# Altium footprint library Pcblib.PcbLib: 281 footprints (part 12 of 18)
Each footprint in its own frame and in the unit in brackets; x right, y up, seen from the top. Pads: shape width x height; smd on the part's side, far side on the other; paste and mask are expansions set on the pad; w line width, h text height; cw(c..) or ccw(c..) is an arc to the next point about the centre after c.
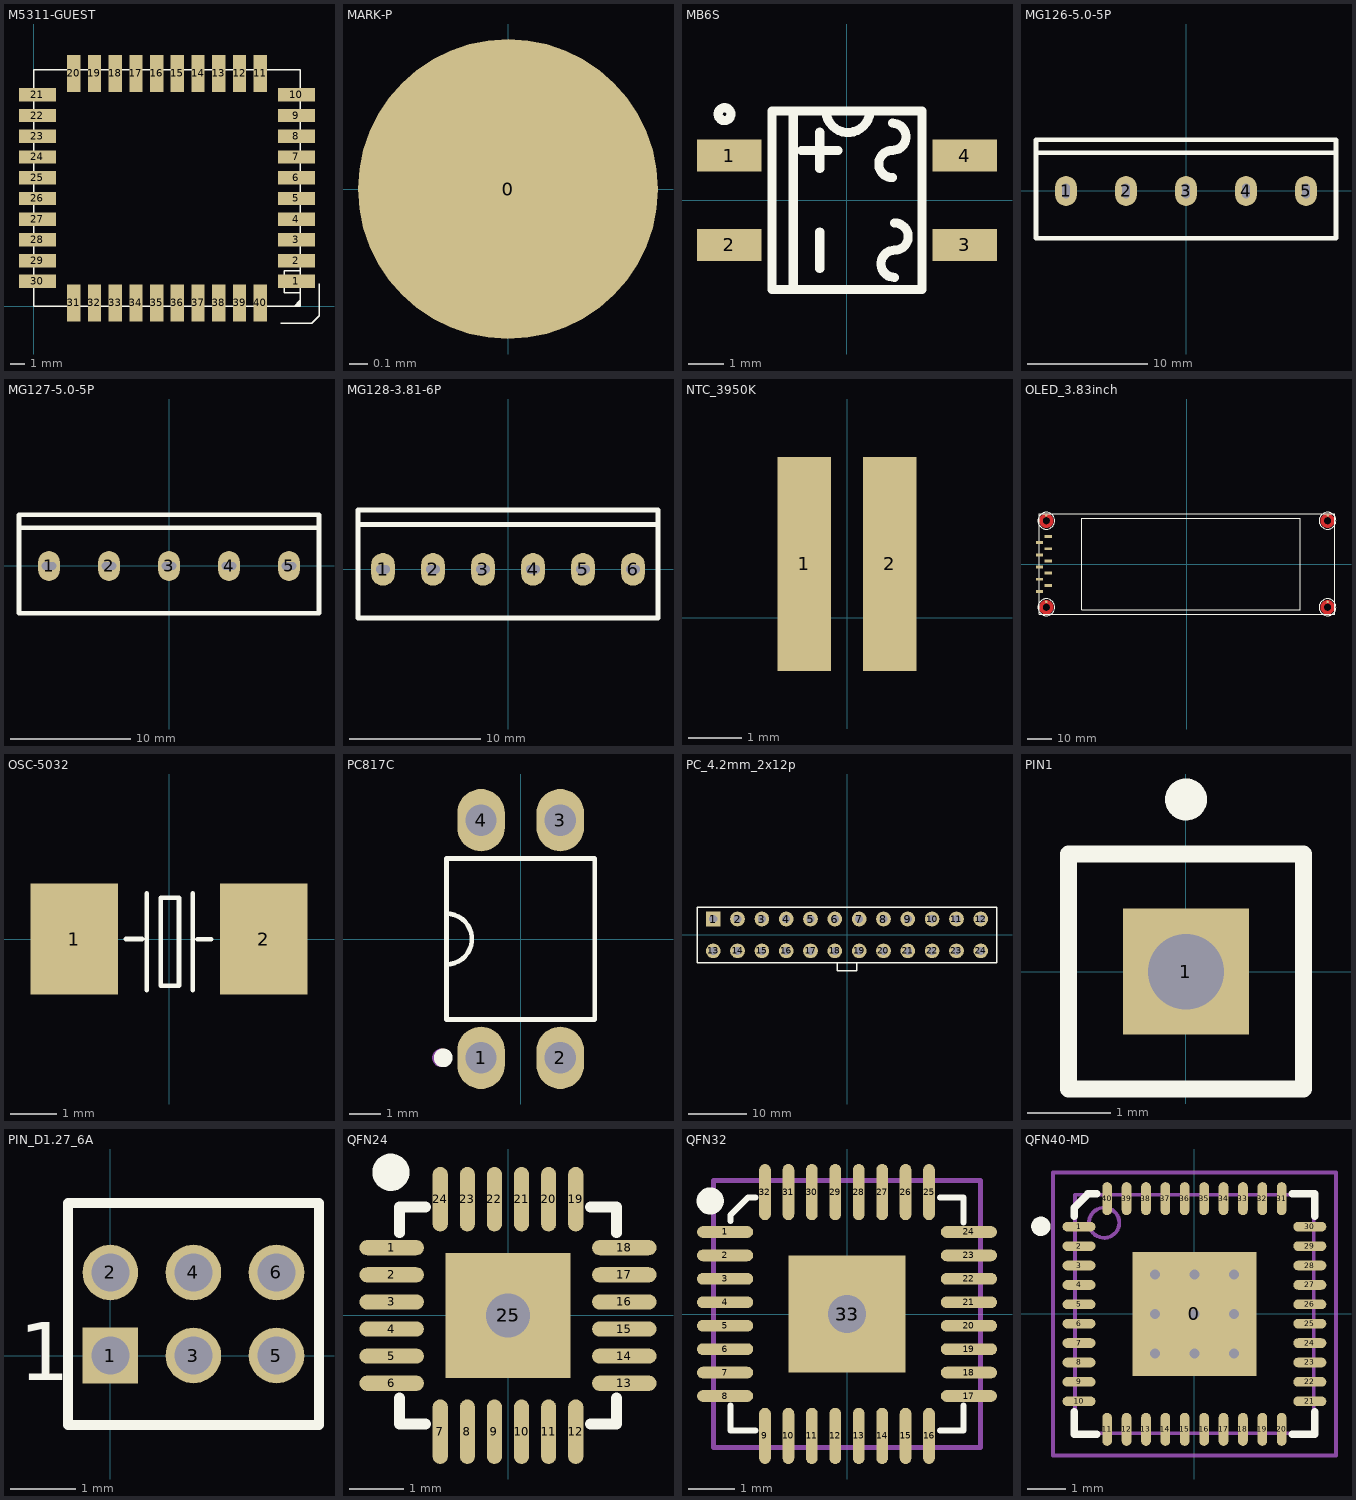
[diagram p11: the footprints below, top view; thin cyan lines are the x and y axes]

## M5311-GUEST [mm]
height 0.1
pads (40):
  rect 2.5x0.9 smd: 1(17.75,1.7) 2(17.75,3.1) 3(17.75,4.5) 4(17.75,5.9) 5(17.75,7.3) 6(17.75,8.7) 7(17.75,10.1) 8(17.75,11.5) 9(17.75,12.9) 10(17.75,14.3) 21(0.25,14.3) 22(0.25,12.9) 23(0.25,11.5) 24(0.25,10.1) 25(0.25,8.7) 26(0.25,7.3) 27(0.25,5.9) 28(0.25,4.5) 29(0.25,3.1) 30(0.25,1.7)
  rect 0.9x2.5 smd: 11(15.3,15.75) 12(13.9,15.75) 13(12.5,15.75) 14(11.1,15.75) 15(9.7,15.75) 16(8.3,15.75) 17(6.9,15.75) 18(5.5,15.75) 19(4.1,15.75) 20(2.7,15.75) 31(2.7,0.25) 32(4.1,0.25) 33(5.5,0.25) 34(6.9,0.25) 35(8.3,0.25) 36(9.7,0.25) 37(11.1,0.25) 38(12.5,0.25) 39(13.9,0.25) 40(15.3,0.25)
Top Overlay:
  lines w0.1: 16.684,-1.125 18.77,-1.125 19.27,-0.625 19.27,1.541 ; 17.626,0.02 17.981,0.375 17.981,0.343 17.654,0.015 17.7,0.015 17.987,0.301 17.987,0.268 17.736,0.017 17.778,0.017 17.988,0.227 17.988,0.165 17.835,0.012 17.897,0.012 17.99,0.105 ; 0,0 18,0 18,16 0,16 0,0 ; 16.918,0.911 16.918,2.397 18,2.397 18,0.911 16.918,0.911
Top Solder:
  lines w0.9: 1.6,4.4 ccw(c1.6,5.9) 1.6,7.4

## MARK-P [mm]
pads (1):
  round 1.6 smd: 0(0,0)

## MB6S [mm]
pads (4):
  rect 1.8x0.9 smd: 1(-3.3,1.25) 2(-3.3,-1.25) 3(3.3,-1.25) 4(3.3,1.25)
Top Overlay:
  circle w0.254: c-3.429,2.413 r0.18
  lines w0.254: -1.504,-2.5 -1.504,2.5 ; -1.27,1.397 -0.254,1.397 ; -0.762,-1.905 -0.762,-0.889 ; -0.762,0.889 -0.762,1.905 ; -0.587,2.461 ccw(c0.027,2.515) 0.642,2.461 ; 1.27,0.635 cw(c1.27,1.016) 1.27,1.397 ccw(c1.27,1.778) 1.27,2.159 ; 1.334,-2.159 cw(c1.334,-1.778) 1.334,-1.397 ccw(c1.334,-1.016) 1.334,-0.635 ; -2.1,-2.5 -2.1,2.5 2.1,2.5 2.1,-2.5 -2.1,-2.5

## MG126-5.0-5P [mm]
pads (5):
  rrect100% 1.8x2.5 hole 0.65 slot 1.2 at 90 deg: 1(-10,0) 2(-5,0) 3(0,0) 4(5,0) 5(10,0)
Top Overlay:
  lines w0.381: -12.5,3.172 12.5,3.172 ; -12.5,-3.94 -12.5,4.27 12.5,4.27 12.5,-3.94 -12.5,-3.94

## MG127-5.0-5P [mm]
pads (5):
  rrect100% 1.8x2.5 hole 0.65 slot 1.2 at 0 deg: 1(-10,0) 2(-5,0) 3(0,0) 4(5,0) 5(10,0)
Top Overlay:
  lines w0.381: -12.5,3.172 12.5,3.172 ; -12.5,-3.94 -12.5,4.27 12.5,4.27 12.5,-3.94 -12.5,-3.94

## MG128-3.81-6P [mm]
pads (6):
  rrect100% 1.8x2.5 hole 0.65 slot 1.05 at 0 deg: 1(-9.525,0) 2(-5.715,0) 3(-1.905,0) 4(1.905,0) 5(5.715,0) 6(9.525,0)
Top Overlay:
  lines w0.381: -11.43,3.412 11.43,3.412 ; -11.43,-3.7 11.43,-3.7 11.43,4.51 -11.43,4.51 -11.43,-3.7

## NTC_3950K [mm] "热敏电阻"
pads (2):
  rect 1x4 smd paste-1: 1(-0.8,1) 2(0.8,1)

## OLED_3.83inch [mm]
height 4.85
pads (14):
  rect 3x1.2 smd: 1(-57.7,11.43) 2(-61.3,8.89) 3(-57.7,6.35) 4(-61.3,3.81) 5(-57.7,1.27) 6(-61.3,-1.27) 7(-57.7,-3.81) 8(-61.3,-6.35) 9(-57.7,-8.89) 10(-61.3,-11.43)
  round 1 smd: 11(-58.522,20.244) 12(-58.547,-15.748) 13(58.496,-15.773) 14(58.522,20.269)
Top Layer:
  circle w1.5: c58.5,-18 r2.25
  circle w1.5: c58.5,18 r2.25
  circle w1.5: c-58.5,18 r2.25
  circle w1.5: c-58.5,-18 r2.25
Top Overlay:
  circle w0.254: c-58.5,-18 r3.5
  circle w0.254: c-58.5,18 r3.5
  circle w0.254: c58.5,-18 r3.5
  circle w0.254: c58.5,18 r3.5
  lines w0.127: -61.5,-21 -61.5,21 61.5,21 61.5,-21 -61.5,-21 ; -43.71,-19 -43.71,19 47.19,19 47.19,-19 -43.71,-19
Top Solder:
  circle w1.7: c58.5,-18 r2.25
  circle w1.7: c58.5,18 r2.25
  circle w1.7: c-58.5,18 r2.25
  circle w1.7: c-58.5,-18 r2.25

## OSC-5032 [mm]
pads (2):
  rect 1.9x2.4 smd: 1(-2.05,0) 2(2.05,0)
Top Overlay:
  lines w0.1: -0.94,0 -0.584,0 ; -0.483,-1.109 -0.483,0.991 ; 0.517,-1.109 0.517,0.991 ; 0.617,-0.009 0.917,-0.009 ; -0.183,-1.009 -0.183,0.89 0.217,0.89 0.217,-1.009 -0.183,-1.009

## PC817C [mm]
pads (4):
  oval 1.524x2 hole 1: 1(-1.27,-3.81) 2(1.27,-3.81) 3(1.27,3.81) 4(-1.27,3.81)
Top Overlay:
  circle w0.3: c-2.484,-3.81 r0.15
  lines w0.152: -2.376,-0.812 ccw(c-2.376,0) -2.376,0.812 ; -2.376,-2.581 -2.376,2.581 2.376,2.581 2.376,-2.581 -2.376,-2.581
Mechanical 15:
  circle w0.3: c-2.54,-3.81 r0.15

## PC_4.2mm_2x12p [mm]
pads (24):
  rect 2.54x2.54 hole 1.397: 1(-23.1,2.75)
  round 2.54 hole 1.397: 2(-18.9,2.75) 3(-14.7,2.75) 4(-10.5,2.75) 5(-6.3,2.75) 6(-2.1,2.75) 7(2.1,2.75) 8(6.3,2.75) 9(10.5,2.75) 10(14.7,2.75) 11(18.9,2.75) 12(23.1,2.75) 13(-23.1,-2.75) 14(-18.9,-2.75) 15(-14.7,-2.75) 16(-10.5,-2.75) 17(-6.3,-2.75) 18(-2.1,-2.75) 19(2.1,-2.75) 20(6.3,-2.75) 21(10.5,-2.75) 22(14.7,-2.75) 23(18.9,-2.75) 24(23.1,-2.75)
Top Overlay:
  lines w0.254: -1.7,-4.8 -1.7,-6.2 1.7,-6.2 1.7,-4.8 ; -25.9,-4.8 25.9,-4.8 25.9,4.8 -25.9,4.8 -25.9,-4.8

## PIN1 [mm] "Generic Antenna; 1 Lead"
pads (1):
  rect 1.5x1.5 hole 0.9: 1(0,0)
Top Overlay:
  circle w0.25: c0,2.05 r0.125
  lines w0.2: -1.4,-1.4 1.4,-1.4 1.4,1.4 -1.4,1.4 -1.4,-1.4

## PIN_D1.27_6A [mm]
pads (6):
  rect 0.85x0.85 hole 0.58: 1(0,0)
  round 0.85 hole 0.58: 2(0,1.27) 3(1.27,0) 4(1.27,1.27) 5(2.54,0) 6(2.54,1.27)
Top Overlay:
  lines w0.152: -0.65,-1.065 3.19,-1.065 3.19,2.335 -0.65,2.335 -0.65,-1.065
  text "1" at -1.397,-0.381 h0.89

## QFN24 [mm]
pads (26):
  oval 1.19x0.28 smd: 1(-2.145,1.25) 2(-2.145,0.75) 3(-2.145,0.25) 4(-2.145,-0.25) 5(-2.145,-0.75) 6(-2.145,-1.25) 13(2.145,-1.25) 14(2.145,-0.75) 15(2.145,-0.25) 16(2.145,0.25) 17(2.145,0.75) 18(2.145,1.25)
  oval 0.28x1.19 smd: 7(-1.25,-2.145) 8(-0.75,-2.145) 9(-0.25,-2.145) 10(0.25,-2.145) 11(0.75,-2.145) 12(1.25,-2.145) 19(1.25,2.145) 20(0.75,2.145) 21(0.25,2.145) 22(-0.25,2.145) 23(-0.75,2.145) 24(-1.25,2.145)
  rect 2.3x2.3 smd: 25(0,0)
  round 1.016 hole 0.813: 25(0,0)
Top Overlay:
  circle w0.381: c-2.159,2.642 r0.152
  lines w0.2: -2,-1.525 -2,-2 -1.525,-2 ; -2,1.525 -2,2 -1.525,2 ; 1.525,-2 2,-2 2,-1.525 ; 1.525,2 2,2 2,1.525
Mechanical 15:
  lines w0.1: -0.381,0 0.381,0 ; 0,-0.381 0,0.381
3D body: height 0.8, standoff 0, extent -2.413,-2.413 2.413,2.413

## QFN32 [mm]
pads (34):
  oval 1.2x0.25 smd: 1(-2.601,1.75) 2(-2.601,1.25) 3(-2.601,0.75) 4(-2.601,0.25) 5(-2.601,-0.25) 6(-2.601,-0.75) 7(-2.601,-1.25) 8(-2.601,-1.75) 17(2.601,-1.75) 18(2.601,-1.25) 19(2.601,-0.75) 20(2.601,-0.25) 21(2.601,0.25) 22(2.601,0.75) 23(2.601,1.25) 24(2.601,1.75)
  oval 0.25x1.2 smd: 9(-1.75,-2.601) 10(-1.25,-2.601) 11(-0.75,-2.601) 12(-0.25,-2.601) 13(0.25,-2.601) 14(0.75,-2.601) 15(1.25,-2.601) 16(1.75,-2.601) 25(1.75,2.601) 26(1.25,2.601) 27(0.75,2.601) 28(0.25,2.601) 29(-0.25,2.601) 30(-0.75,2.601) 31(-1.25,2.601) 32(-1.75,2.601)
  rect 2.5x2.5 smd: 33(0,0)
  round 1.016 hole 0.813: 33(0,0)
Top Overlay:
  circle w0.3: c-2.919,2.413 r0.14
  lines w0.127: -2.489,-1.956 -2.489,-2.489 -1.956,-2.489 ; -2.489,1.981 -2.489,2.108 -2.108,2.489 -1.956,2.489 ; 1.981,-2.489 2.489,-2.489 2.489,-1.956 ; 1.981,2.489 2.489,2.489 2.489,1.956
  lines w0.2: -2.845,2.272 -2.845,2.489
Mechanical 15:
  lines w0.1: -0.5,0 0.5,0 ; 0,-0.5 0,0.5 ; -2.85,-2.85 2.85,-2.85 2.85,2.85 -2.85,2.85 -2.85,-2.85
3D body: height 0.8, standoff 0, extent -2.413,-2.413 2.413,2.413

## QFN40-MD [mm] "QFN, 40-Leads, Body 6.2x6.2mm (max), Pitch 0.50mm, IPC Medium Density"
height 0.8
pads (41):
  rect 3.2x3.2 smd: 0(0,0)
  oval 0.85x0.25 smd: 1(-2.975,2.25) 2(-2.975,1.75) 3(-2.975,1.25) 4(-2.975,0.75) 5(-2.975,0.25) 6(-2.975,-0.25) 7(-2.975,-0.75) 8(-2.975,-1.25) 9(-2.975,-1.75) 10(-2.975,-2.25) 21(2.975,-2.25) 22(2.975,-1.75) 23(2.975,-1.25) 24(2.975,-0.75) 25(2.975,-0.25) 26(2.975,0.25) 27(2.975,0.75) 28(2.975,1.25) 29(2.975,1.75) 30(2.975,2.25)
  oval 0.25x0.85 smd: 11(-2.25,-2.975) 12(-1.75,-2.975) 13(-1.25,-2.975) 14(-0.75,-2.975) 15(-0.25,-2.975) 16(0.25,-2.975) 17(0.75,-2.975) 18(1.25,-2.975) 19(1.75,-2.975) 20(2.25,-2.975) 31(2.25,2.975) 32(1.75,2.975) 33(1.25,2.975) 34(0.75,2.975) 35(0.25,2.975) 36(-0.25,2.975) 37(-0.75,2.975) 38(-1.25,2.975) 39(-1.75,2.975) 40(-2.25,2.975)
via 1.016,1.016 diameter 0.508 hole 0.254
via 0,1.016 diameter 0.508 hole 0.254
via 1.016,0 diameter 0.508 hole 0.254
via -1.016,0 diameter 0.508 hole 0.254
via 0,0 diameter 0.508 hole 0.254
via 1.016,-1.016 diameter 0.508 hole 0.254
via -1.016,-1.016 diameter 0.508 hole 0.254
via 0,-1.016 diameter 0.508 hole 0.254
via -1.016,1.016 diameter 0.508 hole 0.254
Top Overlay:
  circle w0.25: c-3.96,2.261 r0.125
  lines w0.2: -3.1,-2.525 -3.1,-3.1 -2.525,-3.1 ; -3.1,2.525 -3.1,2.742 -2.742,3.1 -2.525,3.1 ; 2.525,-3.1 3.1,-3.1 3.1,-2.525 ; 2.525,3.1 3.1,3.1 3.1,2.525
Mechanical 13:
  circle w0.1: c-2.328,2.354 r0.39
  lines w0.1: -3.075,-3.075 -3.075,3.075 3.075,3.075 3.075,-3.075 -3.075,-3.075
Mechanical 15:
  lines w0.1: -0.5,0 0.5,0 ; 0,-0.5 0,0.5 ; -3.65,-3.65 -3.65,3.65 3.65,3.65 3.65,-3.65 -3.65,-3.65
3D body: height 0.8, standoff 0, extent -3.124,-3.099 3.124,3.15